# Altium footprint library CONN_HDR_MINI_ST.PcbLib: 116 footprints (part 10 of 10)
Each footprint in its own frame and in the unit in brackets; x right, y up, seen from the top. Pads: shape width x height; smd on the part's side, far side on the other; paste and mask are expansions set on the pad; w line width, h text height; cw(c..) or ccw(c..) is an arc to the next point about the centre after c.
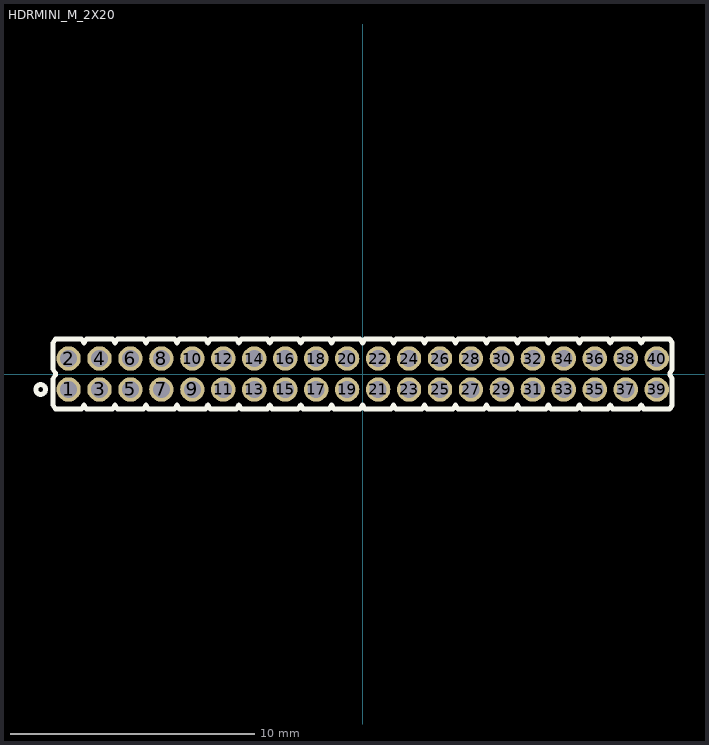
[diagram p9: the footprint, top view; thin cyan lines are the x and y axes]

## HDRMINI_M_2X20 [mm] "mini header (50mil pitch)"
pads (40):
  round 1 hole 0.7 mask+0.05: 1(-12.065,-0.635) 2(-12.065,0.635) 3(-10.795,-0.635) 4(-10.795,0.635) 5(-9.525,-0.635) 6(-9.525,0.635) 7(-8.255,-0.635) 8(-8.255,0.635) 9(-6.985,-0.635) 10(-6.985,0.635) 11(-5.715,-0.635) 12(-5.715,0.635) 13(-4.445,-0.635) 14(-4.445,0.635) 15(-3.175,-0.635) 16(-3.175,0.635) 17(-1.905,-0.635) 18(-1.905,0.635) 19(-0.635,-0.635) 20(-0.635,0.635) 21(0.635,-0.635) 22(0.635,0.635) 23(1.905,-0.635) 24(1.905,0.635) 25(3.175,-0.635) 26(3.175,0.635) 27(4.445,-0.635) 28(4.445,0.635) 29(5.715,-0.635) 30(5.715,0.635) 31(6.985,-0.635) 32(6.985,0.635) 33(8.255,-0.635) 34(8.255,0.635) 35(9.525,-0.635) 36(9.525,0.635) 37(10.795,-0.635) 38(10.795,0.635) 39(12.065,-0.635) 40(12.065,0.635)
Top Overlay:
  circle w0.2: c-13.208,-0.635 r0.2
  lines w0.2: -12.601,-0.035 -12.7,-0.2 -12.7,-1.27 -12.601,-1.435 -11.529,-1.435 -11.43,-1.27 -11.331,-1.435 -10.259,-1.435 -10.16,-1.27 -10.061,-1.435 -8.989,-1.435 -8.89,-1.27 -8.791,-1.435 -7.719,-1.435 -7.62,-1.27 -7.521,-1.435 -6.449,-1.435 -6.35,-1.27 -6.251,-1.435 -5.179,-1.435 -5.08,-1.27 -4.981,-1.435 -3.909,-1.435 -3.81,-1.27 -3.711,-1.435 -2.639,-1.435 -2.54,-1.27 -2.441,-1.435 -1.369,-1.435 -1.27,-1.27 -1.171,-1.435 -0.099,-1.435 0,-1.27 0.099,-1.435 1.171,-1.435 1.27,-1.27 1.369,-1.435 2.441,-1.435 2.54,-1.27 2.639,-1.435 3.711,-1.435 3.81,-1.27 3.909,-1.435 4.981,-1.435 5.08,-1.27 5.179,-1.435 6.251,-1.435 6.35,-1.27 6.449,-1.435 7.521,-1.435 7.62,-1.27 7.719,-1.435 8.791,-1.435 8.89,-1.27 8.989,-1.435 10.061,-1.435 10.16,-1.27 10.259,-1.435 11.331,-1.435 11.43,-1.27 11.529,-1.435 12.601,-1.435 12.7,-1.27 12.7,-0.2 12.601,-0.035 ; -12.601,0.035 -12.7,0.2 -12.7,1.27 -12.601,1.435 -11.529,1.435 -11.43,1.27 -11.331,1.435 -10.259,1.435 -10.16,1.27 -10.061,1.435 -8.989,1.435 -8.89,1.27 -8.791,1.435 -7.719,1.435 -7.62,1.27 -7.521,1.435 -6.449,1.435 -6.35,1.27 -6.251,1.435 -5.179,1.435 -5.08,1.27 -4.981,1.435 -3.909,1.435 -3.81,1.27 -3.711,1.435 -2.639,1.435 -2.54,1.27 -2.441,1.435 -1.369,1.435 -1.27,1.27 -1.171,1.435 -0.099,1.435 0,1.27 0.099,1.435 1.171,1.435 1.27,1.27 1.369,1.435 2.441,1.435 2.54,1.27 2.639,1.435 3.711,1.435 3.81,1.27 3.909,1.435 4.981,1.435 5.08,1.27 5.179,1.435 6.251,1.435 6.35,1.27 6.449,1.435 7.521,1.435 7.62,1.27 7.719,1.435 8.791,1.435 8.89,1.27 8.989,1.435 10.061,1.435 10.16,1.27 10.259,1.435 11.331,1.435 11.43,1.27 11.529,1.435 12.601,1.435 12.7,1.27 12.7,0.2 12.601,0.035
3D body: height 7.3, standoff -2.5, extent -12.265,0.435 -11.865,0.835
3D body: height 2.8, standoff 0, extent -12.7,0 -11.43,1.27
3D body: height 7.3, standoff -2.5, extent -10.995,0.435 -10.595,0.835
3D body: height 2.8, standoff 0, extent -11.43,0 -10.16,1.27
3D body: height 7.3, standoff -2.5, extent -12.265,-0.835 -11.865,-0.435
3D body: height 2.8, standoff 0, extent -12.7,-1.27 -11.43,0
3D body: height 7.3, standoff -2.5, extent -10.995,-0.835 -10.595,-0.435
3D body: height 2.8, standoff 0, extent -11.43,-1.27 -10.16,0
3D body: height 7.3, standoff -2.5, extent -9.725,0.435 -9.325,0.835
3D body: height 2.8, standoff 0, extent -10.16,0 -8.89,1.27
3D body: height 7.3, standoff -2.5, extent -8.455,0.435 -8.055,0.835
3D body: height 2.8, standoff 0, extent -8.89,0 -7.62,1.27
3D body: height 7.3, standoff -2.5, extent -9.725,-0.835 -9.325,-0.435
3D body: height 2.8, standoff 0, extent -10.16,-1.27 -8.89,0
3D body: height 7.3, standoff -2.5, extent -8.455,-0.835 -8.055,-0.435
3D body: height 2.8, standoff 0, extent -8.89,-1.27 -7.62,0
3D body: height 7.3, standoff -2.5, extent -7.185,0.435 -6.785,0.835
3D body: height 2.8, standoff 0, extent -7.62,0 -6.35,1.27
3D body: height 7.3, standoff -2.5, extent -5.915,0.435 -5.515,0.835
3D body: height 2.8, standoff 0, extent -6.35,0 -5.08,1.27
3D body: height 7.3, standoff -2.5, extent -7.185,-0.835 -6.785,-0.435
3D body: height 2.8, standoff 0, extent -7.62,-1.27 -6.35,0
3D body: height 7.3, standoff -2.5, extent -5.915,-0.835 -5.515,-0.435
3D body: height 2.8, standoff 0, extent -6.35,-1.27 -5.08,0
3D body: height 7.3, standoff -2.5, extent -4.645,0.435 -4.245,0.835
3D body: height 2.8, standoff 0, extent -5.08,0 -3.81,1.27
3D body: height 7.3, standoff -2.5, extent -3.375,0.435 -2.975,0.835
3D body: height 2.8, standoff 0, extent -3.81,0 -2.54,1.27
3D body: height 7.3, standoff -2.5, extent -4.645,-0.835 -4.245,-0.435
3D body: height 2.8, standoff 0, extent -5.08,-1.27 -3.81,0
3D body: height 7.3, standoff -2.5, extent -3.375,-0.835 -2.975,-0.435
3D body: height 2.8, standoff 0, extent -3.81,-1.27 -2.54,0
3D body: height 7.3, standoff -2.5, extent -2.105,0.435 -1.705,0.835
3D body: height 2.8, standoff 0, extent -2.54,0 -1.27,1.27
3D body: height 7.3, standoff -2.5, extent -0.835,0.435 -0.435,0.835
3D body: height 2.8, standoff 0, extent -1.27,0 0,1.27
3D body: height 7.3, standoff -2.5, extent -2.105,-0.835 -1.705,-0.435
3D body: height 2.8, standoff 0, extent -2.54,-1.27 -1.27,0
3D body: height 7.3, standoff -2.5, extent -0.835,-0.835 -0.435,-0.435
3D body: height 2.8, standoff 0, extent -1.27,-1.27 0,0
3D body: height 7.3, standoff -2.5, extent 0.435,0.435 0.835,0.835
3D body: height 2.8, standoff 0, extent 0,0 1.27,1.27
3D body: height 7.3, standoff -2.5, extent 1.705,0.435 2.105,0.835
3D body: height 2.8, standoff 0, extent 1.27,0 2.54,1.27
3D body: height 7.3, standoff -2.5, extent 0.435,-0.835 0.835,-0.435
3D body: height 2.8, standoff 0, extent 0,-1.27 1.27,0
3D body: height 7.3, standoff -2.5, extent 1.705,-0.835 2.105,-0.435
3D body: height 2.8, standoff 0, extent 1.27,-1.27 2.54,0
3D body: height 7.3, standoff -2.5, extent 2.975,0.435 3.375,0.835
3D body: height 2.8, standoff 0, extent 2.54,0 3.81,1.27
3D body: height 7.3, standoff -2.5, extent 4.245,0.435 4.645,0.835
3D body: height 2.8, standoff 0, extent 3.81,0 5.08,1.27
3D body: height 7.3, standoff -2.5, extent 2.975,-0.835 3.375,-0.435
3D body: height 2.8, standoff 0, extent 2.54,-1.27 3.81,0
3D body: height 7.3, standoff -2.5, extent 4.245,-0.835 4.645,-0.435
3D body: height 2.8, standoff 0, extent 3.81,-1.27 5.08,0
3D body: height 7.3, standoff -2.5, extent 5.515,0.435 5.915,0.835
3D body: height 2.8, standoff 0, extent 5.08,0 6.35,1.27
3D body: height 7.3, standoff -2.5, extent 6.785,0.435 7.185,0.835
3D body: height 2.8, standoff 0, extent 6.35,0 7.62,1.27
3D body: height 7.3, standoff -2.5, extent 5.515,-0.835 5.915,-0.435
3D body: height 2.8, standoff 0, extent 5.08,-1.27 6.35,0
3D body: height 7.3, standoff -2.5, extent 6.785,-0.835 7.185,-0.435
3D body: height 2.8, standoff 0, extent 6.35,-1.27 7.62,0
3D body: height 7.3, standoff -2.5, extent 8.055,0.435 8.455,0.835
3D body: height 2.8, standoff 0, extent 7.62,0 8.89,1.27
3D body: height 7.3, standoff -2.5, extent 9.325,0.435 9.725,0.835
3D body: height 2.8, standoff 0, extent 8.89,0 10.16,1.27
3D body: height 7.3, standoff -2.5, extent 8.055,-0.835 8.455,-0.435
3D body: height 2.8, standoff 0, extent 7.62,-1.27 8.89,0
3D body: height 7.3, standoff -2.5, extent 9.325,-0.835 9.725,-0.435
3D body: height 2.8, standoff 0, extent 8.89,-1.27 10.16,0
3D body: height 7.3, standoff -2.5, extent 10.595,0.435 10.995,0.835
3D body: height 2.8, standoff 0, extent 10.16,0 11.43,1.27
3D body: height 7.3, standoff -2.5, extent 11.865,0.435 12.265,0.835
3D body: height 2.8, standoff 0, extent 11.43,0 12.7,1.27
3D body: height 7.3, standoff -2.5, extent 10.595,-0.835 10.995,-0.435
3D body: height 2.8, standoff 0, extent 10.16,-1.27 11.43,0
3D body: height 7.3, standoff -2.5, extent 11.865,-0.835 12.265,-0.435
3D body: height 2.8, standoff 0, extent 11.43,-1.27 12.7,0